# Altium footprint library THU VIEN V1.PcbLib: 400 footprints (part 1 of 25)
Each footprint in its own frame and in the unit in brackets; x right, y up, seen from the top. Pads: shape width x height; smd on the part's side, far side on the other; paste and mask are expansions set on the pad; w line width, h text height; cw(c..) or ccw(c..) is an arc to the next point about the centre after c.
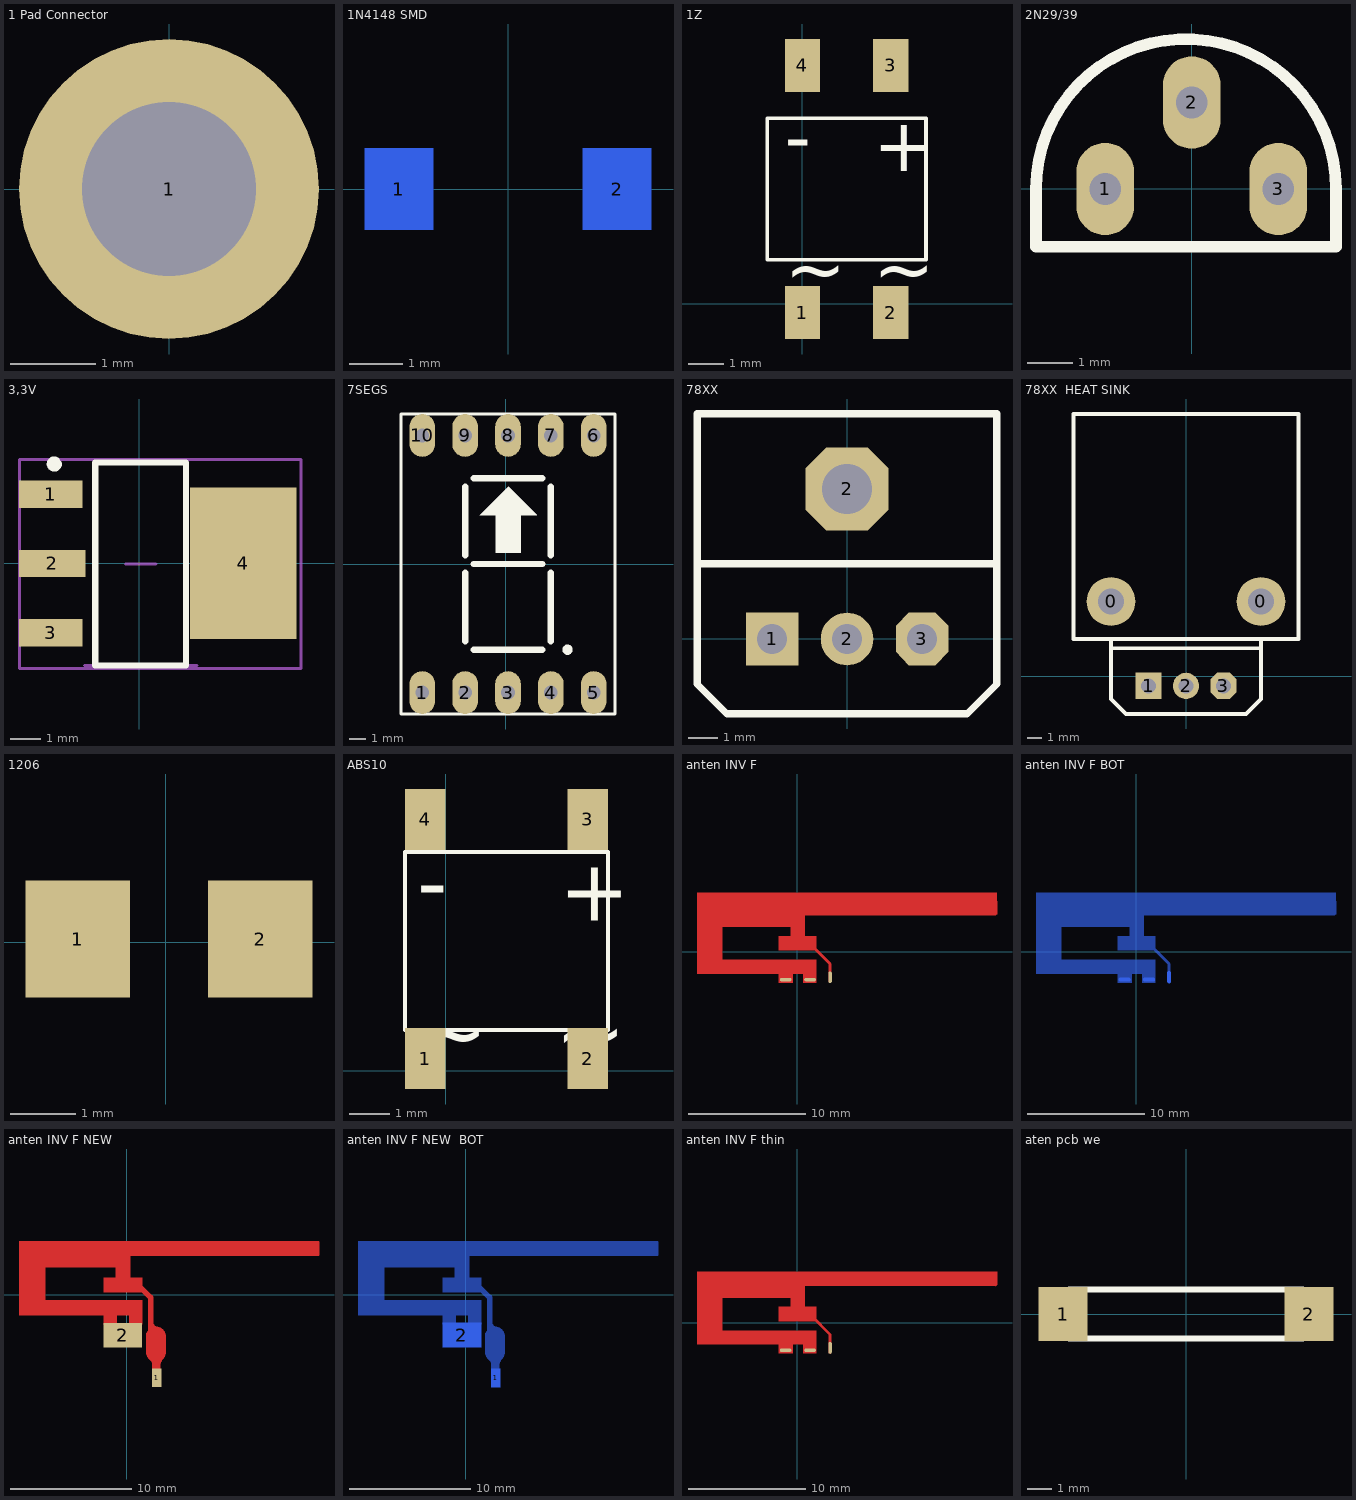
[diagram p0: the footprints below, top view; thin cyan lines are the x and y axes]

## 1 Pad Connector [mm] "1 Pad han day noi"
pads (1):
  round 3.5 hole 2.032: 1(0,0)

## 1N4148 SMD [mil]
pads (2):
  rect 50x60 smd far side: 1(-80,0) 2(80,0)
Bottom Overlay:
  lines w1.97: -53.31,-23.62 -53.25,23.62 ; 53.31,-23.62 53.37,23.62 ; -105,-30 105,-30 105,30 -105,30 -105,-30
  lines w10: -5.5,-24.5 19,0 19,1 -5,25
3D body: height -15.75, standoff -78.74, extent -72.84,-31.5 72.84,31.5

## 1Z [mm]
pads (4):
  rect 1x1.5 smd: 1(0,-0.25) 2(2.5,-0.25) 3(2.5,6.75) 4(0,6.75)
Top Overlay:
  lines w0.1: -1,1.25 3.5,1.25 3.5,5.25 -1,5.25 -1,1.25
  text "~" at 2,0.25 h1.52
  text "~" at -0.5,0.25 h1.52
  text "+" at 2,3.75 h1.52
  text "-" at -0.5,4 h1.52
3D body: height 1.5, standoff 0.2, extent -1,1.25 3.5,5.25

## 2N29/39 [mm]
pads (3):
  oval 1.27x2.032 hole 0.7: 1(-1.905,0) 2(0,1.905) 3(1.905,0)
Top Overlay:
  lines w0.254: -3.429,-1.27 3.175,-1.27 3.175,0 ccw(c-0.127,0) -3.429,0 -3.429,-1.27
3D body: height 7.62, standoff 0, extent -11.751,-5.827 3.429,9.383

## 3,3V [mm]
pads (4):
  rect 2.1x0.9 smd: 1(-2.921,2.286) 3(-2.921,-2.286)
  rect 2.2x0.9 smd: 2(-2.87,0)
  rect 3.5x5 smd: 4(3.429,0)
Top Overlay:
  lines w0.2: -1.456,-3.368 -1.456,3.332 1.544,3.332 1.544,-3.368 -1.456,-3.368
  lines w0.25: -2.749,3.393 ccw(c-2.806,3.282) -2.681,3.282
Mechanical 13:
  lines w0.1: -1.806,-3.368 1.894,-3.368
Mechanical 15:
  lines w0.1: -0.456,-0.018 0.544,-0.018 ; -3.956,-3.468 -3.956,3.432 5.334,3.432 5.334,-3.468 -3.956,-3.468
3D body: height 1.74, standoff 0.06, extent -3.582,-3.25 3.378,3.25

## 7SEGS [mil] "DIP 10 Leads; Body 12 x 15 mm; Pitch 0.5 mm"
height 300
pads (10):
  oval 60x100 hole 32: 1(-195,-300) 2(-95,-300) 3(5,-300) 4(105,-300) 5(205,-300) 6(205,300) 7(105,300) 8(5,300) 9(-95,300) 10(-195,300)
Top Overlay:
  circle w12: c144,-200 r6
  region: -61,114 5,180 7,180 72,115 72,114 35,114 35,26 -24,26 -24,114
  lines w7: -245,-350 255,-350 255,350 -245,350 -245,-350
  lines w15: -95,-180 -95,-20 ; -95,-180 -95,-20 ; -95,-180 -95,-20 ; -95,-180 -95,-20 ; -95,-180 -95,-20 ; -95,-180 -95,-20 ; -95,-180 -95,-20 ; -95,-180 -95,-20 ; -95,20 -95,180 ; -95,20 -95,180 ; -95,20 -95,180 ; -95,20 -95,180 ; -95,20 -95,180 ; -95,20 -95,180 ; -95,20 -95,180 ; -95,20 -95,180 ; -75,-200 85,-200 ; -75,-200 85,-200 ; -75,-200 85,-200 ; -75,-200 85,-200 ; -75,0 85,0 ; -75,0 85,0 ; -75,0 85,0 ; -75,0 85,0 ; -75,0 85,0 ; -75,0 85,0 ; -75,0 85,0 ; -75,0 85,0 ; -75,200 85,200 ; -75,200 85,200 ; -75,200 85,200 ; -75,200 85,200 ; 105,-180 105,-20 ; 105,-180 105,-20 ; 105,-180 105,-20 ; 105,-180 105,-20 ; 105,-180 105,-20 ; 105,-180 105,-20 ; 105,-180 105,-20 ; 105,-180 105,-20 ; 105,20 105,180 ; 105,20 105,180 ; 105,20 105,180 ; 105,20 105,180 ; 105,20 105,180 ; 105,20 105,180 ; 105,20 105,180 ; 105,20 105,180
3D body: height 316.25, standoff -156.19, extent -245,-375 255,375

## 78XX [mil]
pads (4):
  rect 70x70 hole 40: 1(-100,0)
  round 70 hole 40: 2(0,0)
  oct 110.24x110.24 hole 66.93: 2(0,200)
  oct 70x70 hole 40: 3(100,0)
Top Overlay:
  lines w10: -200,100 200,100 ; -200,-60 -200,300 200,300 200,-60 160,-100 -160,-100 -200,-60
3D body: height 854.72, standoff -300, extent -220.72,-58.85 220.73,125.8
3D body: height 980, standoff -142.05, extent -245.03,44 251.03,299.94

## 78XX  HEAT SINK [mil]
pads (5):
  round 130 hole 70: 0(-200,200) 0(200,200)
  rect 70x70 hole 40: 1(-100,-25)
  round 70 hole 40: 2(0,-25)
  oct 70x70 hole 40: 3(100,-25)
Top Overlay:
  lines w10: -200,75 200,75 ; -200,75 -200,-60 -160,-100 160,-100 200,-60 200,75 ; -200,75 -200,100 ; -200,100 -300,100 -300,700 300,700 300,100 200,100 ; -200,100 200,100 ; 200,75 200,100
3D body: height 854.72, standoff -300, extent -220.72,-83.85 220.73,100.8
3D body: height 196.85, standoff -196.85, extent 170.71,170.54 229.53,229.48
3D body: height 196.85, standoff -196.85, extent -229.29,170.54 -170.47,229.48
3D body: height 984.25, standoff 19.68, extent -300,100 300,700

## 1206 [mm]
pads (2):
  rect 1.6x1.8 smd: 1(-1.349,0.051) 2(1.451,0.051)
Bottom Overlay:
  lines w0.2: -0.249,-0.749 0.351,-0.749 ; -0.249,0.851 0.351,0.851
3D body: height 0.57, standoff 0, extent -1.499,-0.739 1.601,0.813

## ABS10 [mm]
pads (4):
  rect 1x1.5 smd: 1(-0.5,0.3) 2(3.5,0.3) 3(3.5,6.2) 4(-0.5,6.2)
Top Overlay:
  lines w0.1: -1,1 4,1 4,5.4 -1,5.4 -1,1
  text "~" at 2.7,0.2 h1.52
  text "~" at -0.7,0.2 h1.52
  text "+" at 2.8,3.7 h1.52
  text "-" at -0.7,3.9 h1.52
3D body: height 1.5, standoff 0.2, extent -1,1 4,5.4

## anten INV F [mm]
pads (3):
  oval 0.3x1 smd: 1(2.794,-2.159)
  oval 1x0.3 smd: 2(1.092,-2.362) 3(-0.991,-2.362)
Top Layer:
  rectangle: -8.542,4.318 17.018,5.055
  region: 17.018,3.202 16.928,3.112 0.631,3.122 0.631,1.328 1.63,1.328 1.63,0.122 -1.567,0.122 -1.567,1.328 -0.568,1.328 -0.568,2.125 -6.382,2.128 -6.382,-0.682 1.638,-0.682 1.638,-2.622 0.518,-2.622 0.518,-1.862 -0.382,-1.862 -0.382,-2.622 -1.582,-2.622 -1.582,-1.862 -8.542,-1.862 -8.542,2.115 -8.542,4.318 17.018,4.318
  lines w0.25: 1.27,0.508 2.794,-1.016 2.794,-2.54

## anten INV F BOT [mm]
pads (3):
  oval 0.3x1 smd far side: 1(2.794,-2.159)
  oval 1x0.3 smd far side: 2(1.092,-2.362) 3(-0.991,-2.362)
Bottom Layer:
  rectangle: -8.542,4.318 17.018,5.055
  region: 17.018,3.202 16.928,3.112 0.631,3.122 0.631,1.328 1.63,1.328 1.63,0.122 -1.567,0.122 -1.567,1.328 -0.568,1.328 -0.568,2.125 -6.382,2.128 -6.382,-0.682 1.638,-0.682 1.638,-2.622 0.518,-2.622 0.518,-1.862 -0.382,-1.862 -0.382,-2.622 -1.582,-2.622 -1.582,-1.862 -8.542,-1.862 -8.542,2.115 -8.542,4.318 17.018,4.318
  lines w0.25: 1.27,0.508 2.794,-1.016 2.794,-2.54

## anten INV F NEW [mil]
pads (2):
  rect 30x60 smd: 1(97.98,-270)
  rect 125x80 smd: 2(-12.02,-131)
Top Layer:
  rectangle: -350,-68 51,-17
  rectangle: -36,56 12,175
  rectangle: -76,8 52,56
  rectangle: -350,88 12,175
  rectangle: -350,-68 -264,175
  rectangle: 4.5,129.37 625.56,172.68
  rectangle: 85.2,-277.13 109.81,-206.26
  rectangle: 85.18,-277.31 109.79,-217.27
  rectangle: 82.24,-111.59 90.12,-99.78
  rectangle: 87.15,-276.33 109.79,-213.34
  rectangle: 14.49,22.27 51.89,56.72
  rectangle: -75.07,9.29 50.91,56.53
  rectangle: 14.33,22.27 51.73,56.72
  rectangle: -75.23,9.29 50.76,56.53
  rectangle: 83.21,-277.31 109.79,-212.35
  rectangle: -76,-97 -31,-65
  rectangle: 7,-96 51,-64
  rectangle: -71.14,-99.78 -34.88,-93.87
  rectangle: 7.45,-135.39 31.07,-64.01
  rectangle: 7.61,-135.39 31.23,-64.01
  rectangle: 21.06,-146.04 42.48,-93.87
  lines w3.94: 65.5,-180.67 cw(c71.41,-184.61) 75.35,-178.7 ; 84.21,-94.05 ccw(c95.52,-93.56) 96.02,-104.88 ; 85.19,-89.13 ccw(c99.95,-90.12) 98.97,-104.88
  lines w5: -344.22,172.68 624.56,172.68 ; -43.75,129.37 624.56,129.37 ; 72.39,-117.68 69.68,-120.39 ccw(c79.76,-130.47) 65.5,-130.47 65.5,-188.74 ccw(c88.79,-188.74) 72.32,-205.21 79.33,-212.22 ccw(c91.09,-200.45) 91.09,-217.09 ; 74.46,-207.34 78.4,-211.28 cw(c54.87,-234.8) 88.14,-234.8 ; 91.09,-215.22 91.09,-196.42 ; 91.09,-186.57 91.09,-195.36 ccw(c107.9,-195.36) 96.02,-207.24 ; 107.83,-231.85 cw(c143.47,-231.85) 118.27,-206.65 119.64,-205.28 ; 112.75,-196.92 112.75,-182.64 ; 597.98,172.68 624.56,172.68 ; 599.95,129.37 624.56,129.37 ; 624.56,130.35 624.56,172.68 ; 624.56,148.07 624.56,129.37 ; 624.56,160.87 624.56,172.68
  lines w6: 109.79,-121.62 cw(c109.79,-126.37) 113.15,-123.01 117.89,-127.74 cw(c99.4,-146.22) 125.54,-146.22
  lines w10: 84.2,-208.23 cw(c84.2,-212.98) 87.56,-209.62
  lines w18.11: 39.09,30.15 78.09,-8.85 78.09,-129.01 ; 87.02,-150.77 93.14,-150.77
  lines w64.96: 96.02,-186.57 96.02,-135.21

## anten INV F NEW  BOT [mil]
pads (2):
  rect 30x60 smd far side: 1(97.98,-270)
  rect 125x80 smd far side: 2(-12.02,-131)
Bottom Layer:
  rectangle: -350,-68 51,-17
  rectangle: -36,56 12,175
  rectangle: -76,8 52,56
  rectangle: -350,88 12,175
  rectangle: -350,-68 -264,175
  rectangle: 4.5,129.37 625.56,172.68
  rectangle: 85.2,-277.13 109.81,-206.26
  rectangle: 85.18,-277.31 109.79,-217.27
  rectangle: 82.24,-111.59 90.12,-99.78
  rectangle: 87.15,-276.33 109.79,-213.34
  rectangle: 14.49,22.27 51.89,56.72
  rectangle: -75.07,9.29 50.91,56.53
  rectangle: 14.33,22.27 51.73,56.72
  rectangle: -75.23,9.29 50.76,56.53
  rectangle: 83.21,-277.31 109.79,-212.35
  rectangle: -76,-97 -31,-65
  rectangle: 7,-96 51,-64
  rectangle: -71.14,-99.78 -34.88,-93.87
  rectangle: 7.45,-135.39 31.07,-64.01
  rectangle: 7.61,-135.39 31.23,-64.01
  rectangle: 21.06,-146.04 42.48,-93.87
  lines w3.94: 65.5,-180.67 cw(c71.41,-184.61) 75.35,-178.7 ; 84.21,-94.05 ccw(c95.52,-93.56) 96.02,-104.88 ; 85.19,-89.13 ccw(c99.95,-90.12) 98.97,-104.88
  lines w5: -344.22,172.68 624.56,172.68 ; -43.75,129.37 624.56,129.37 ; 72.39,-117.68 69.68,-120.39 ccw(c79.76,-130.47) 65.5,-130.47 65.5,-188.74 ccw(c88.79,-188.74) 72.32,-205.21 79.33,-212.22 ccw(c91.09,-200.45) 91.09,-217.09 ; 74.46,-207.34 78.4,-211.28 cw(c54.87,-234.8) 88.14,-234.8 ; 91.09,-215.22 91.09,-196.42 ; 91.09,-186.57 91.09,-195.36 ccw(c107.9,-195.36) 96.02,-207.24 ; 107.83,-231.85 cw(c143.47,-231.85) 118.27,-206.65 119.64,-205.28 ; 112.75,-196.92 112.75,-182.64 ; 597.98,172.68 624.56,172.68 ; 599.95,129.37 624.56,129.37 ; 624.56,130.35 624.56,172.68 ; 624.56,148.07 624.56,129.37 ; 624.56,160.87 624.56,172.68
  lines w6: 109.79,-121.62 cw(c109.79,-126.37) 113.15,-123.01 117.89,-127.74 cw(c99.4,-146.22) 125.54,-146.22
  lines w10: 84.2,-208.23 cw(c84.2,-212.98) 87.56,-209.62
  lines w18.11: 39.09,30.15 78.09,-8.85 78.09,-129.01 ; 87.02,-150.77 93.14,-150.77
  lines w64.96: 96.02,-186.57 96.02,-135.21

## anten INV F thin [mm]
pads (3):
  oval 0.3x1 smd: 1(2.794,-2.159)
  oval 1x0.3 smd: 2(1.092,-2.362) 3(-0.991,-2.362)
Top Layer:
  region: 17.018,3.202 16.928,3.112 0.631,3.122 0.631,1.328 1.63,1.328 1.63,0.122 -1.567,0.122 -1.567,1.328 -0.568,1.328 -0.568,2.125 -6.382,2.128 -6.382,-0.682 1.638,-0.682 1.638,-2.622 0.518,-2.622 0.518,-1.862 -0.382,-1.862 -0.382,-2.622 -1.582,-2.622 -1.582,-1.862 -8.542,-1.862 -8.542,2.115 -8.542,4.318 17.018,4.318
  lines w0.25: 1.27,0.508 2.794,-1.016 2.794,-2.54

## aten pcb we [mm]
pads (2):
  rect 2x2.2 smd: 1(-5,0) 2(5,0)
Top Overlay:
  lines w0.254: -4.75,-1 -4.75,1 4.75,1 4.75,-1 -4.75,-1
3D body: height 1.2, standoff 0.1, extent -4.75,-1 4.75,1